# Altium footprint library JL_PCB.PCBLIB: 1129 footprints (part 5 of 72)
Each footprint in its own frame and in the unit in brackets; x right, y up, seen from the top. Pads: shape width x height; smd on the part's side, far side on the other; paste and mask are expansions set on the pad; w line width, h text height; cw(c..) or ccw(c..) is an arc to the next point about the centre after c.
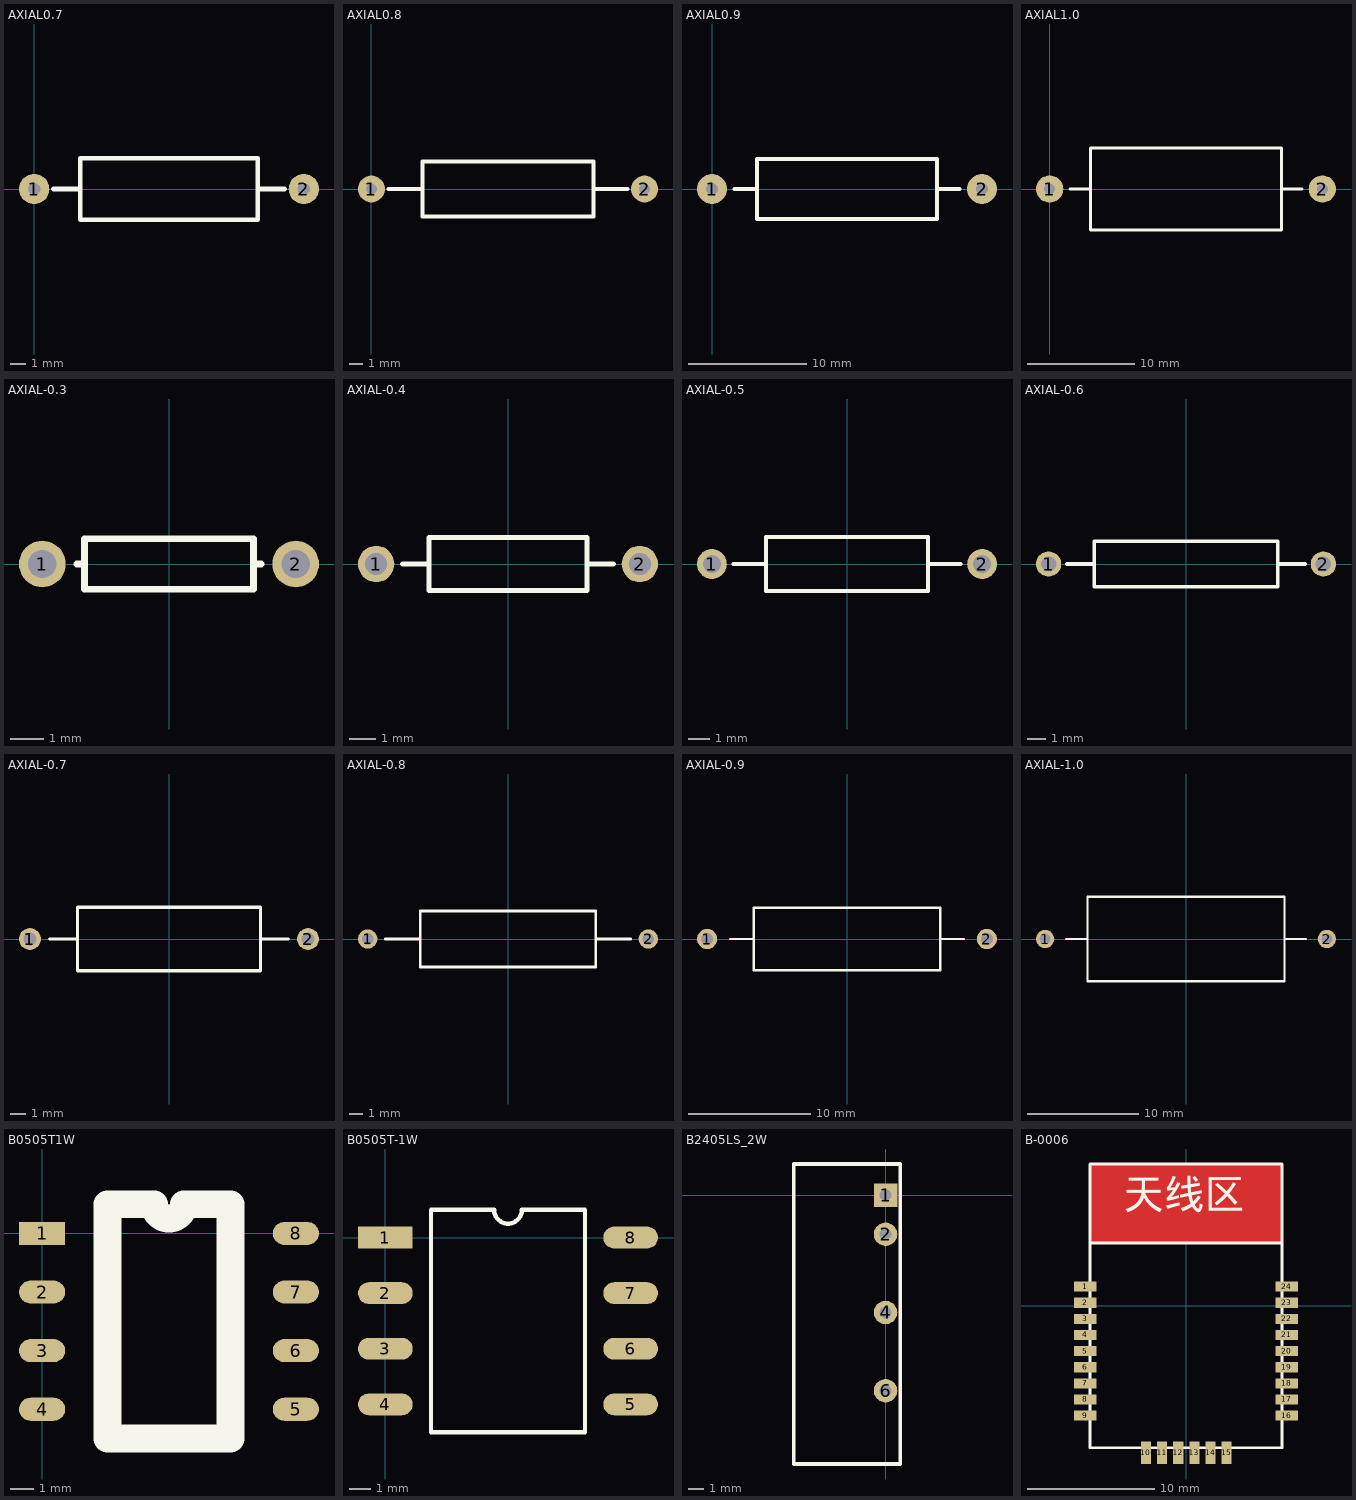
[diagram p4: the footprints below, top view; thin cyan lines are the x and y axes]

## AXIAL0.7 [mm]
pads (2):
  round 2 hole 0.813: 1(0,0) 2(17.78,0)
TopOverlay:
  lines w0.305: 1.27,0 3.048,0 ; 14.732,0 16.51,0 ; 3.048,-2.032 14.732,-2.032 14.732,2.032 3.048,2.032 3.048,-2.032

## AXIAL0.8 [mm]
pads (2):
  round 2 hole 0.813: 1(0,0) 2(20.32,0)
TopOverlay:
  lines w0.305: 1.27,0 3.81,0 ; 16.51,0 19.05,0 ; 3.81,-2.032 16.51,-2.032 16.51,2.032 3.81,2.032 3.81,-2.032

## AXIAL0.9 [mil]
pads (2):
  round 100 hole 40: 1(0,0) 2(900,0)
TopOverlay:
  lines w12: 75,0 150,0 ; 750,0 825,0 ; 150,-100 150,100 750,100 750,-100 150,-100

## AXIAL1.0 [mil]
pads (2):
  round 100 hole 40: 1(0,0) 2(1000,0)
TopOverlay:
  lines w12: 75,0 150,0 ; 850,0 925,0 ; 150,-150 150,150 850,150 850,-150 150,-150

## AXIAL-0.3 [mm] "Axial Device, Thru-Hole; 2 Leads; 0.3 in Pin Spacing"
height 1.524
pads (2):
  round 1.4 hole 0.85: 1(-3.81,0) 2(3.81,0)
TopOverlay:
  lines w0.2: -2.769,0 -2.54,0 ; 2.769,0 2.54,0 ; 2.54,0 2.54,-0.762 -2.54,-0.762 -2.54,0.762 2.54,0.762 2.54,0
3D body "AXIAL0.3.STEP": height 2.51, standoff -1, extent -4.064,-1.079 4.064,0.864

## AXIAL-0.4 [mm] "Axial Device, Thru-Hole; 2 Leads; 0.4 in Pin Spacing"
height 2.032
pads (2):
  round 1.4 hole 0.85: 1(-5.08,0) 2(5.08,0)
TopOverlay:
  lines w0.2: -4.064,0 -3.048,0 ; 3.048,0 4.064,0 ; -3.048,-1.016 -3.048,1.016 3.048,1.016 3.048,-1.016 -3.048,-1.016
3D body "AXIAL0.4.STEP": height 3.26, standoff -2, extent -5.405,-1.27 5.355,1.25

## AXIAL-0.5 [mm] "Axial Device, Thru-Hole; 2 Leads; 0.5 in Pin Spacing"
height 2.54
pads (2):
  round 1.4 hole 0.85: 1(-6.35,0) 2(6.35,0)
TopOverlay:
  lines w0.2: -5.334,0 -3.81,0 ; 3.81,0 5.334,0 ; -3.81,-1.27 3.81,-1.27 3.81,1.27 -3.81,1.27 -3.81,-1.27
3D body "AXIAL0.5.STEP": height 3.6, standoff -1, extent -6.731,-1.473 6.731,1.384

## AXIAL-0.6 [mm] "Axial Device, Thru-Hole; 2 Leads; 0.6 in Pin Spacing"
height 2.54
pads (2):
  round 1.4 hole 0.85: 1(-7.62,0) 2(7.62,0)
TopOverlay:
  lines w0.2: -6.604,0 -5.08,0 ; 5.08,0 6.604,0 ; -5.08,-1.27 -5.08,1.27 5.08,1.27 5.08,-1.27 -5.08,-1.27
3D body "AXIAL0.6.STEP": height 5, standoff -3, extent -7.918,-1.981 8.122,2.019

## AXIAL-0.7 [mm] "Axial Device, Thru-Hole; 2 Leads; 0.7 in Pin Spacing"
height 4.064
pads (2):
  round 1.4 hole 0.85: 1(-8.89,0) 2(8.89,0)
TopOverlay:
  lines w0.2: -7.62,0 -5.842,0 ; 5.842,0 7.62,0 ; -5.842,-2.032 5.842,-2.032 5.842,2.032 -5.842,2.032 -5.842,-2.032
3D body "AXIAL0.7.STEP": height 5.5, standoff -2.5, extent -9.315,-2.515 9.265,2.485

## AXIAL-0.8 [mm] "Axial Device, Thru-Hole; 2 Leads; 0.8 in Pin Spacing"
height 4.064
pads (2):
  round 1.4 hole 0.85: 1(-10.16,0) 2(10.16,0)
TopOverlay:
  lines w0.2: -8.89,0 -6.35,0 ; 6.35,0 8.89,0 ; -6.35,-2.032 6.35,-2.032 6.35,2.032 -6.35,2.032 -6.35,-2.032

## AXIAL-0.9 [mm] "Axial Device, Thru-Hole; 2 Leads; 0.9 in Pin Spacing"
height 5.08
pads (2):
  round 1.65 hole 1: 1(-11.43,0) 2(11.43,0)
TopOverlay:
  lines w0.2: -9.525,0 -7.62,0 ; 7.62,0 9.525,0 ; -7.62,-2.54 -7.62,2.54 7.62,2.54 7.62,-2.54 -7.62,-2.54

## AXIAL-1.0 [mm] "Axial Device, Thru-Hole; 2 Leads; 1.0 in Pin Spacing"
height 7.62
pads (2):
  round 1.65 hole 1: 1(-12.7,0) 2(12.7,0)
TopOverlay:
  lines w0.2: -10.795,0 -8.89,0 ; 8.89,0 10.795,0 ; -8.89,-3.81 8.89,-3.81 8.89,3.81 -8.89,3.81 -8.89,-3.81

## B0505T1W [mm]
pads (8):
  rect 2x1 smd: 1(0,0)
  oval 2x1 smd: 2(0,-2.54) 3(0,-5.08) 4(0,-7.62) 5(11,-7.62) 6(11,-5.08) 7(11,-2.54) 8(11,0)
TopOverlay:
  lines w1.2: 2.835,-8.89 8.165,-8.89 8.165,1.27 6.135,1.27 cw(c5.5,1.27) 4.865,1.27 2.835,1.27 2.835,-8.89

## B0505T-1W [mm]
pads (8):
  rect 2.5x1 smd: 1(0,0)
  oval 2.5x1 smd: 2(0,-2.54) 3(0,-5.08) 4(0,-7.62) 5(11.2,-7.62) 6(11.2,-5.08) 7(11.2,-2.54) 8(11.2,0)
TopOverlay:
  lines w0.2: 2.085,-8.89 9.115,-8.89 9.115,1.27 6.235,1.27 cw(c5.6,1.27) 4.965,1.27 2.085,1.27 2.085,-8.89

## B2405LS_2W [mil]
pads (4):
  rect 60x60 hole 30: 1(0,0)
  round 60 hole 30: 2(0,-100) 4(0,-300) 6(0,-500)
TopOverlay:
  lines w10: -235,-687.72 37.72,-687.72 37.72,80 -235,80 -235,-687.72

## B-0006 [mil]
pads (24):
  rect 70x31.5 smd: 1(-312.5,60) 2(-312.5,10) 3(-312.5,-40) 4(-312.5,-90) 5(-312.5,-140) 6(-312.5,-190) 7(-312.5,-240) 8(-312.5,-290) 9(-312.5,-340) 16(312.5,-340) 17(312.5,-290) 18(312.5,-240) 19(312.5,-190) 20(312.5,-140) 21(312.5,-90) 22(312.5,-40) 23(312.5,10) 24(312.5,60)
  rect 31.5x70 smd: 10(-124.04,-455) 11(-74.04,-455) 12(-24.04,-455) 13(25.96,-455) 14(75.96,-455) 15(125.96,-455)
TopLayer:
  pour cut-out: -298,439 -298,195 297,195 298,196 298,439
TopOverlay:
  lines w8: -297.5,195 297.5,195 ; -297.5,-440 -297.5,440 297.5,440 297.5,-440 -297.5,-440
  text "天线区" at -192.5,270 h157.48